# Altium footprint library дроссели и трансы.PcbLib: 41 footprints (part 1 of 3)
Each footprint in its own frame and in the unit in brackets; x right, y up, seen from the top. Pads: shape width x height; smd on the part's side, far side on the other; paste and mask are expansions set on the pad; w line width, h text height; cw(c..) or ccw(c..) is an arc to the next point about the centre after c.
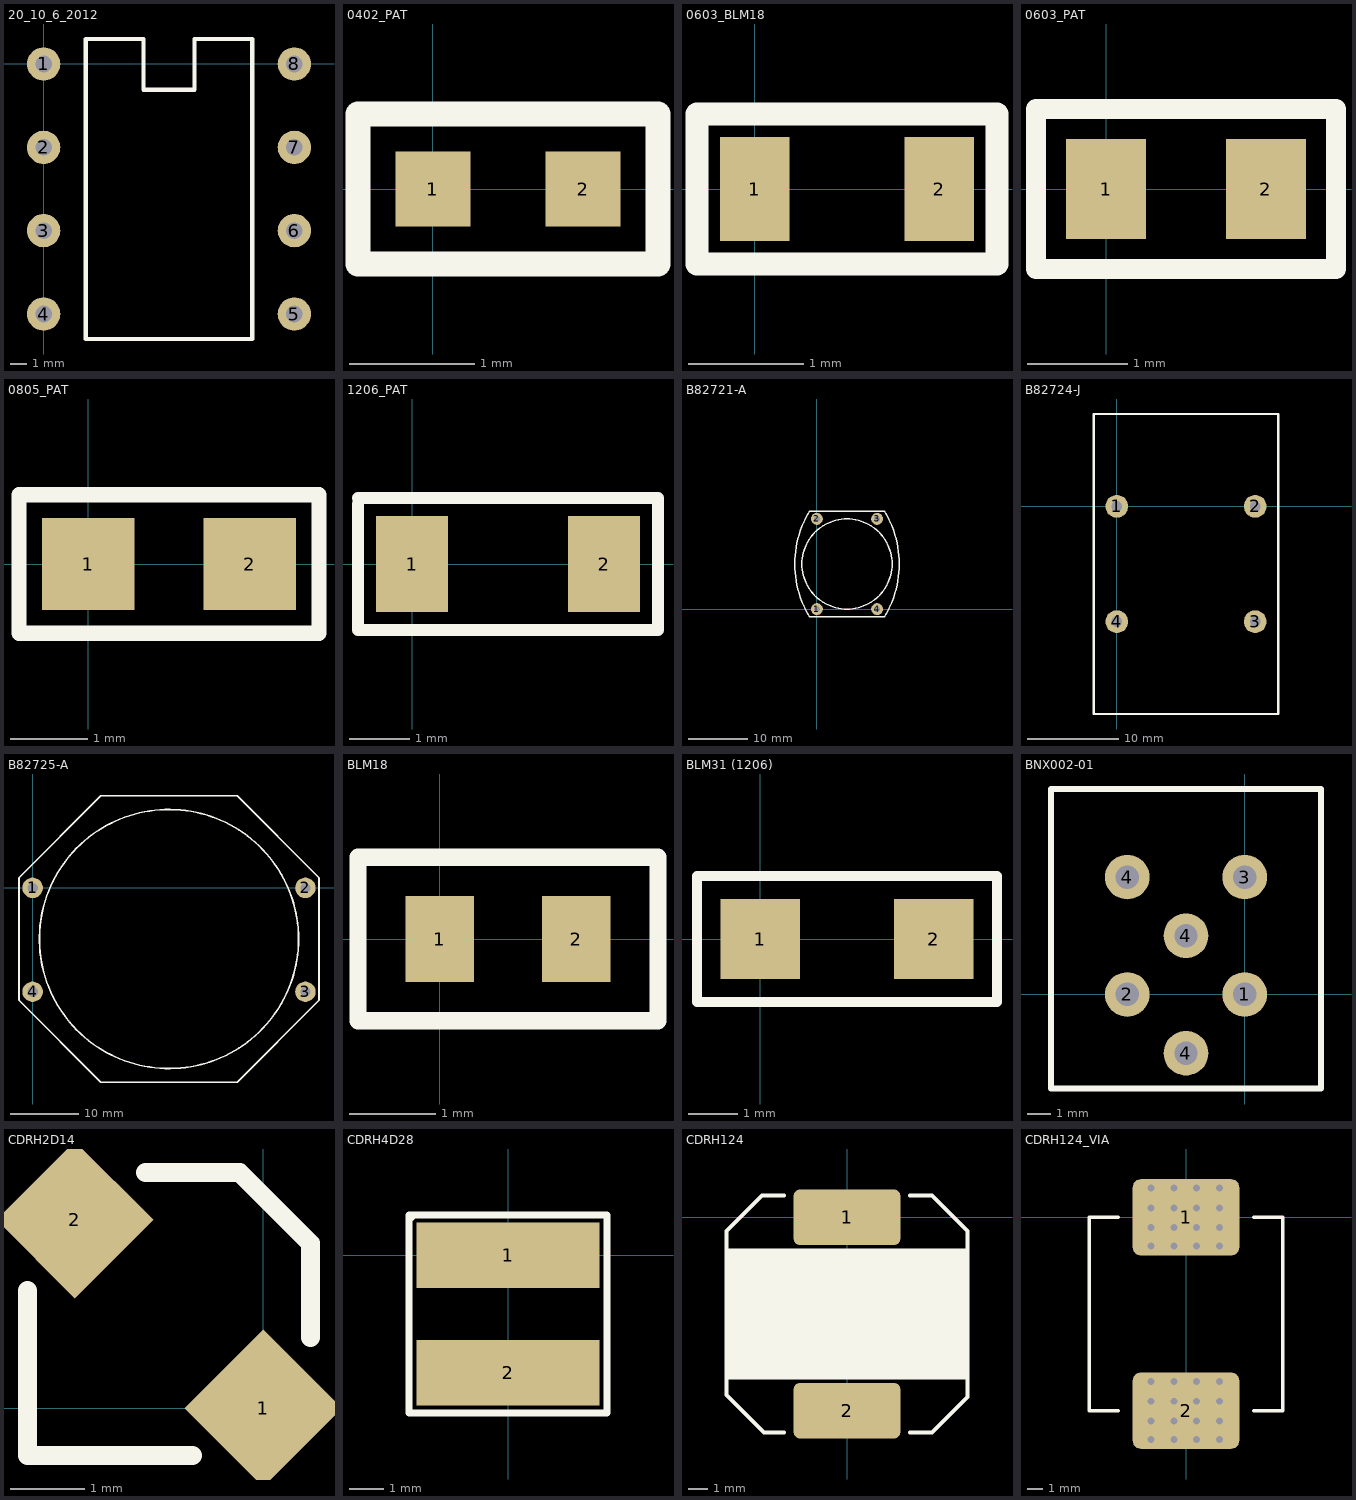
[diagram p0: the footprints below, top view; thin cyan lines are the x and y axes]

## 20_10_6_2012 [mm]
pads (8):
  round 2 hole 1: 1(0,0) 2(0,-5) 3(0,-10) 4(0,-15) 5(15.04,-15) 6(15.04,-10) 7(15.04,-5) 8(15.04,0)
Top Overlay:
  lines w0.254: 2.52,-16.5 2.52,1.5 5.996,1.5 5.996,-1.548 9.044,-1.548 9.044,1.5 12.52,1.5 12.52,-16.5 2.52,-16.5

## 0402_PAT [mm]
pads (2):
  rect 0.6x0.6 smd: 1(0,0) 2(1.2,0)
Top Overlay:
  lines w0.2: -0.6,-0.6 -0.6,0.6 1.8,0.6 1.8,-0.6 -0.6,-0.6

## 0603_BLM18 [mm] "Ферритовый фильтр 0603(1608)"
height 0.8
pads (2):
  rect 0.6x0.9 smd mask+0.025: 1(0,0) 2(1.6,0)
Top Overlay:
  lines w0.2: -0.5,-0.65 -0.5,0.65 2.1,0.65 2.1,-0.65 -0.5,-0.65
3D body "User Library-BLM18K.SLDPRT": height 0.8, standoff 0, extent 0,-0.4 1.6,0.4

## 0603_PAT [mm]
pads (2):
  rect 0.8x1 smd: 1(0,0) 2(1.6,0)
Top Overlay:
  lines w0.2: -0.7,-0.8 2.3,-0.8 2.3,0.8 -0.7,0.8 -0.7,-0.8

## 0805_PAT [mm]
pads (2):
  rect 1.2x1.2 smd: 1(0,0) 2(2.1,0)
Top Overlay:
  lines w0.2: -0.9,-0.9 -0.9,0.9 3,0.9 3,-0.9 -0.9,-0.9

## 1206_PAT [mm]
pads (2):
  rect 1.2x1.6 smd: 1(0,0) 2(3.2,0)
Top Overlay:
  lines w0.2: -0.9,1 -0.9,-1.1 4.1,-1.1 4.1,1.1 -0.9,1.1

## B82721-A [mm]
pads (4):
  round 2 hole 1: 1(0,0) 2(0,15.24) 3(10.16,15.24) 4(10.16,0)
Top Overlay:
  circle w0.254: c5.08,7.62 r7.62
  lines w0.254: -1.27,-1.27 11.43,-1.27 ; -1.27,16.51 11.43,16.51 ; -1.264,-1.257 cw(c13.335,7.62) -1.264,16.497 ; 11.424,-1.257 ccw(c-3.175,7.62) 11.424,16.497

## B82724-J [mm]
pads (4):
  round 2.5 hole 1.2: 1(0,0) 2(15.24,0) 3(15.24,-12.7) 4(0,-12.7)
Top Overlay:
  lines w0.254: -2.54,-22.86 17.78,-22.86 17.78,10.16 -2.54,10.16 -2.54,-22.86

## B82725-A [mm]
pads (4):
  round 3 hole 1.5: 1(0,0) 2(40.005,0) 3(40.005,-15.24) 4(0,-15.24)
Top Overlay:
  circle w0.254: c20,-7.5 r19
  lines w0.254: -2,-16.5 10,-28.5 30,-28.5 42,-16.5 42,1.5 30,13.5 10,13.5 -2,1.5 -2,-16.5
3D body "User Library-B82725A.SLDPRT": height 25, standoff -3.5, extent -2,-28.7 42,13.7

## BLM18 [mm]
pads (2):
  rect 0.8x1 smd: 1(0,0) 2(1.587,0)
Top Overlay:
  lines w0.2: -0.953,-0.953 2.54,-0.953 2.54,0.953 -0.953,0.953 -0.953,-0.953

## BLM31 (1206) [mm]
pads (2):
  rect 1.6x1.6 smd: 1(0,0) 2(3.492,0)
Top Overlay:
  lines w0.2: -1.27,-1.27 4.763,-1.27 4.763,1.27 -1.27,1.27 -1.27,-1.27

## BNX002-01 [mm]
pads (6):
  round 1.9 hole 1: 1(0,0) 2(-5,0) 3(0,5) 4(-5,5) 4(-2.5,-2.5) 4(-2.5,2.5)
Top Overlay:
  lines w0.254: -8.25,-4 3.25,-4 3.25,8.75 -8.25,8.75 -8.25,-4
Mechanical 13:
  lines w0.1: -8.25,-4.025 3.25,-4.025 3.25,8.75 -8.25,8.75 -8.25,-4.025
  text ".Designator" at -3.075,3.325 h1.5
3D body "User Library-Murata_BNX002.STEP": height 12.5, standoff -5, extent -8,-3.5 3,8.5

## CDRH2D14 [mm]
pads (2):
  rect 1.5x1.5 smd rot 45: 1(0,0) 2(-2.54,2.54)
Top Overlay:
  lines w0.254: -3.175,1.587 -3.175,-0.635 -0.953,-0.635 ; -1.587,3.175 -0.318,3.175 0.635,2.222 0.635,0.953

## CDRH4D28 [mm]
pads (2):
  rect 5.3x1.9 smd mask+0.025: 1(0,0) 2(0,-3.4)
Top Overlay:
  lines w0.2: -2.875,1.025 -2.725,1.175 ; -2.875,-4.575 2.875,-4.575 2.875,1.175 -2.875,1.175 -2.875,-4.575
3D body "User Library-CDRH4D28.sldprt": height 2.91, standoff 0, extent -2.45,-4.15 2.45,0.75

## CDRH124 [mm]
pads (2):
  rrect20% 5.4x2.8 smd mask+0.025: 1(0,0) 2(0,-9.8)
Top Overlay:
  region: -6,-8.2 6,-8.2 6,-1.6 -6,-1.6
  lines w0.2: -3.2,-10.9 -4.2,-10.9 -6.1,-9 -6.1,-0.7 -4.3,1.1 -3.2,1.1 ; 3.2,-10.9 4.3,-10.9 6.1,-9.1 6.1,-0.7 4.3,1.1 3.2,1.1
3D body "User Library-CDRH124_Sumida (1).SLDPRT": height 4.5, standoff -0.05, extent -6.15,-11.05 6.15,1.25

## CDRH124_VIA [mm]
pads (2):
  rrect20% 7x5 smd: 1(0,0) 2(0,-12.7)
via -2.3,-14.58 diameter 1.016 hole 0.457
via -2.3,-10.78 diameter 1.016 hole 0.457
via -2.3,0.62 diameter 1.016 hole 0.457
via -2.3,-0.68 diameter 1.016 hole 0.457
via -2.3,-1.88 diameter 1.016 hole 0.457
via 2.2,-14.58 diameter 1.016 hole 0.457
via 2.2,-10.78 diameter 1.016 hole 0.457
via 2.2,0.62 diameter 1.016 hole 0.457
via 2.2,-0.68 diameter 1.016 hole 0.457
via 2.2,-1.88 diameter 1.016 hole 0.457
via -2.3,-12.08 diameter 1.016 hole 0.457
via -2.3,-13.38 diameter 1.016 hole 0.457
via -2.3,1.92 diameter 1.016 hole 0.457
via 2.2,-12.08 diameter 1.016 hole 0.457
via 2.2,-13.38 diameter 1.016 hole 0.457
via 2.2,1.92 diameter 1.016 hole 0.457
via -0.8,-14.58 diameter 1.016 hole 0.457
via 0.7,-14.58 diameter 1.016 hole 0.457
via -0.8,-10.78 diameter 1.016 hole 0.457
via 0.7,-10.78 diameter 1.016 hole 0.457
via -0.8,0.62 diameter 1.016 hole 0.457
via 0.7,0.62 diameter 1.016 hole 0.457
via -0.8,-0.68 diameter 1.016 hole 0.457
via 0.7,-0.68 diameter 1.016 hole 0.457
via -0.8,-1.88 diameter 1.016 hole 0.457
via 0.7,-1.88 diameter 1.016 hole 0.457
via -0.8,-12.08 diameter 1.016 hole 0.457
via 0.7,-12.08 diameter 1.016 hole 0.457
via -0.8,-13.38 diameter 1.016 hole 0.457
via 0.7,-13.38 diameter 1.016 hole 0.457
via -0.8,1.92 diameter 1.016 hole 0.457
via 0.7,1.92 diameter 1.016 hole 0.457
Top Overlay:
  lines w0.254: -4.445,-12.7 -6.35,-12.7 -6.35,0 -4.445,0 ; 4.445,-12.7 6.35,-12.7 6.35,0 4.445,0